# Altium schematic symbol library LATTICEPLDS_Library.SchLib: 291 symbols (part 31 of 32) (continued)
## LX256-F484C (continued)
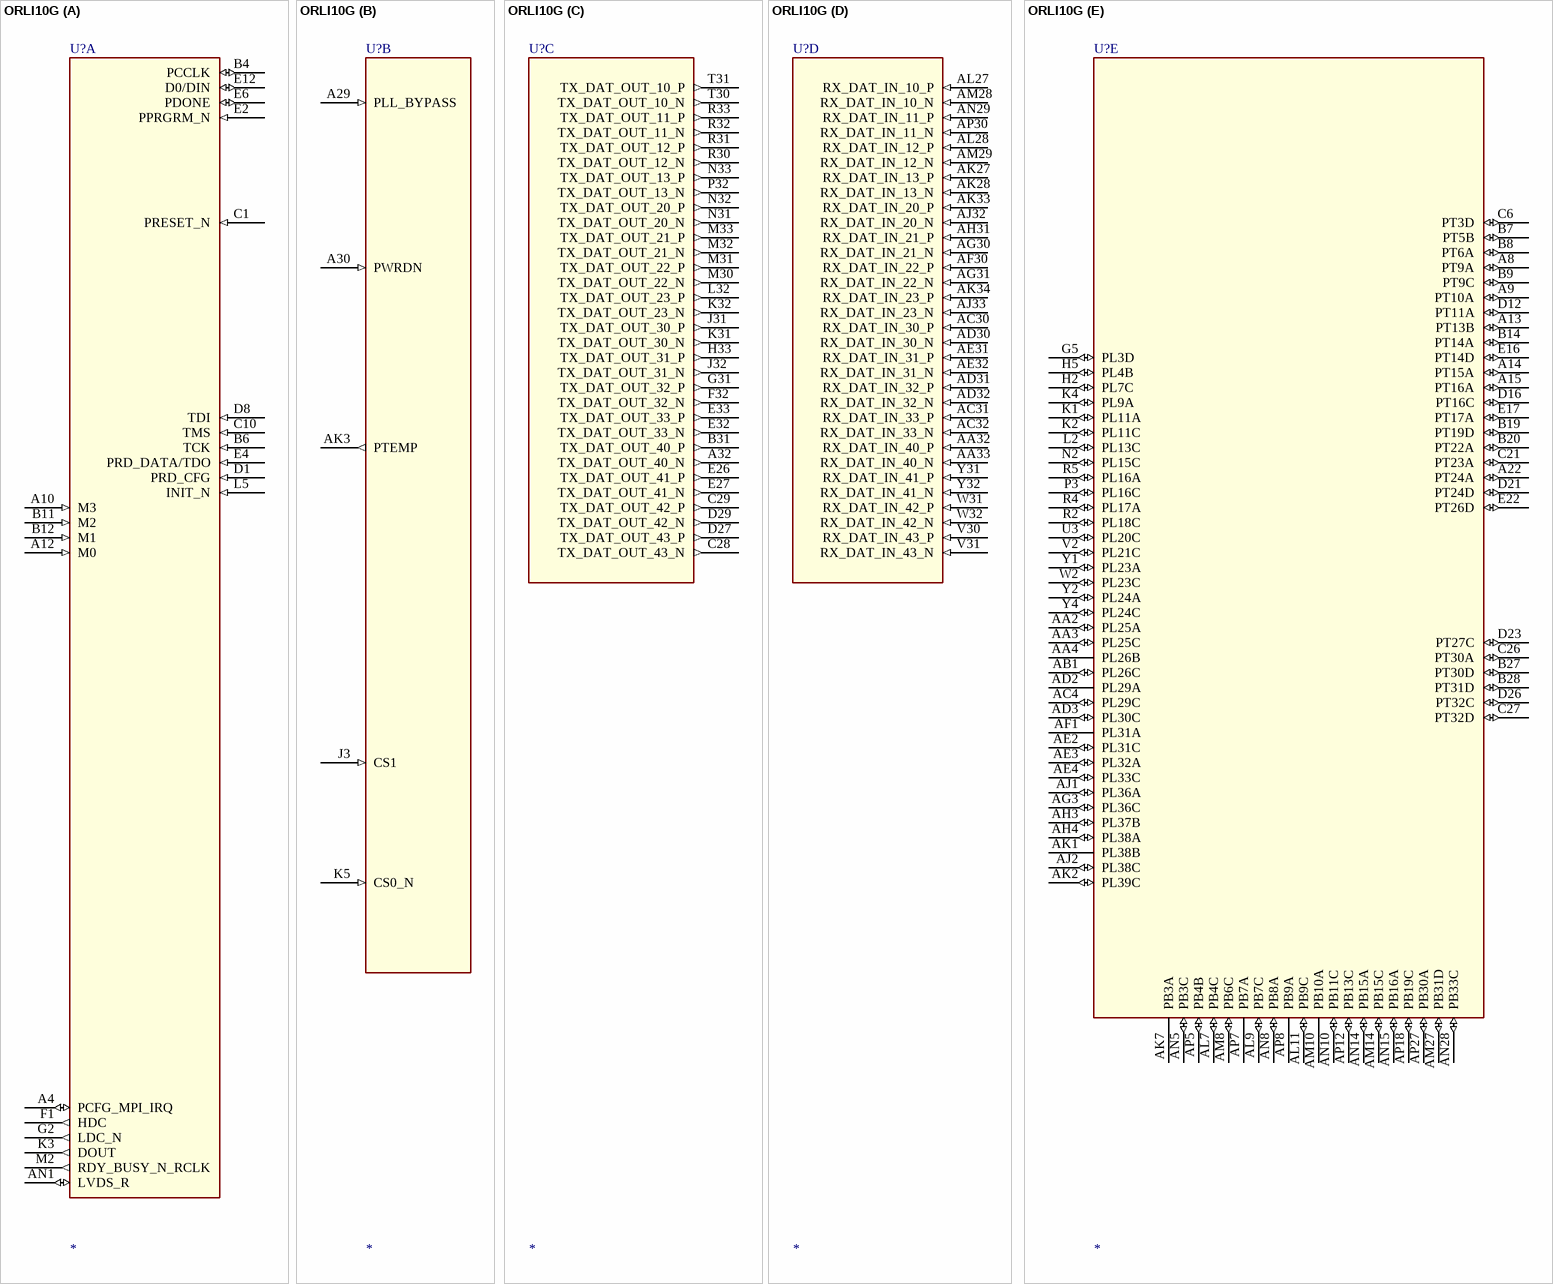
[diagram p287: symbol ORLI10G]

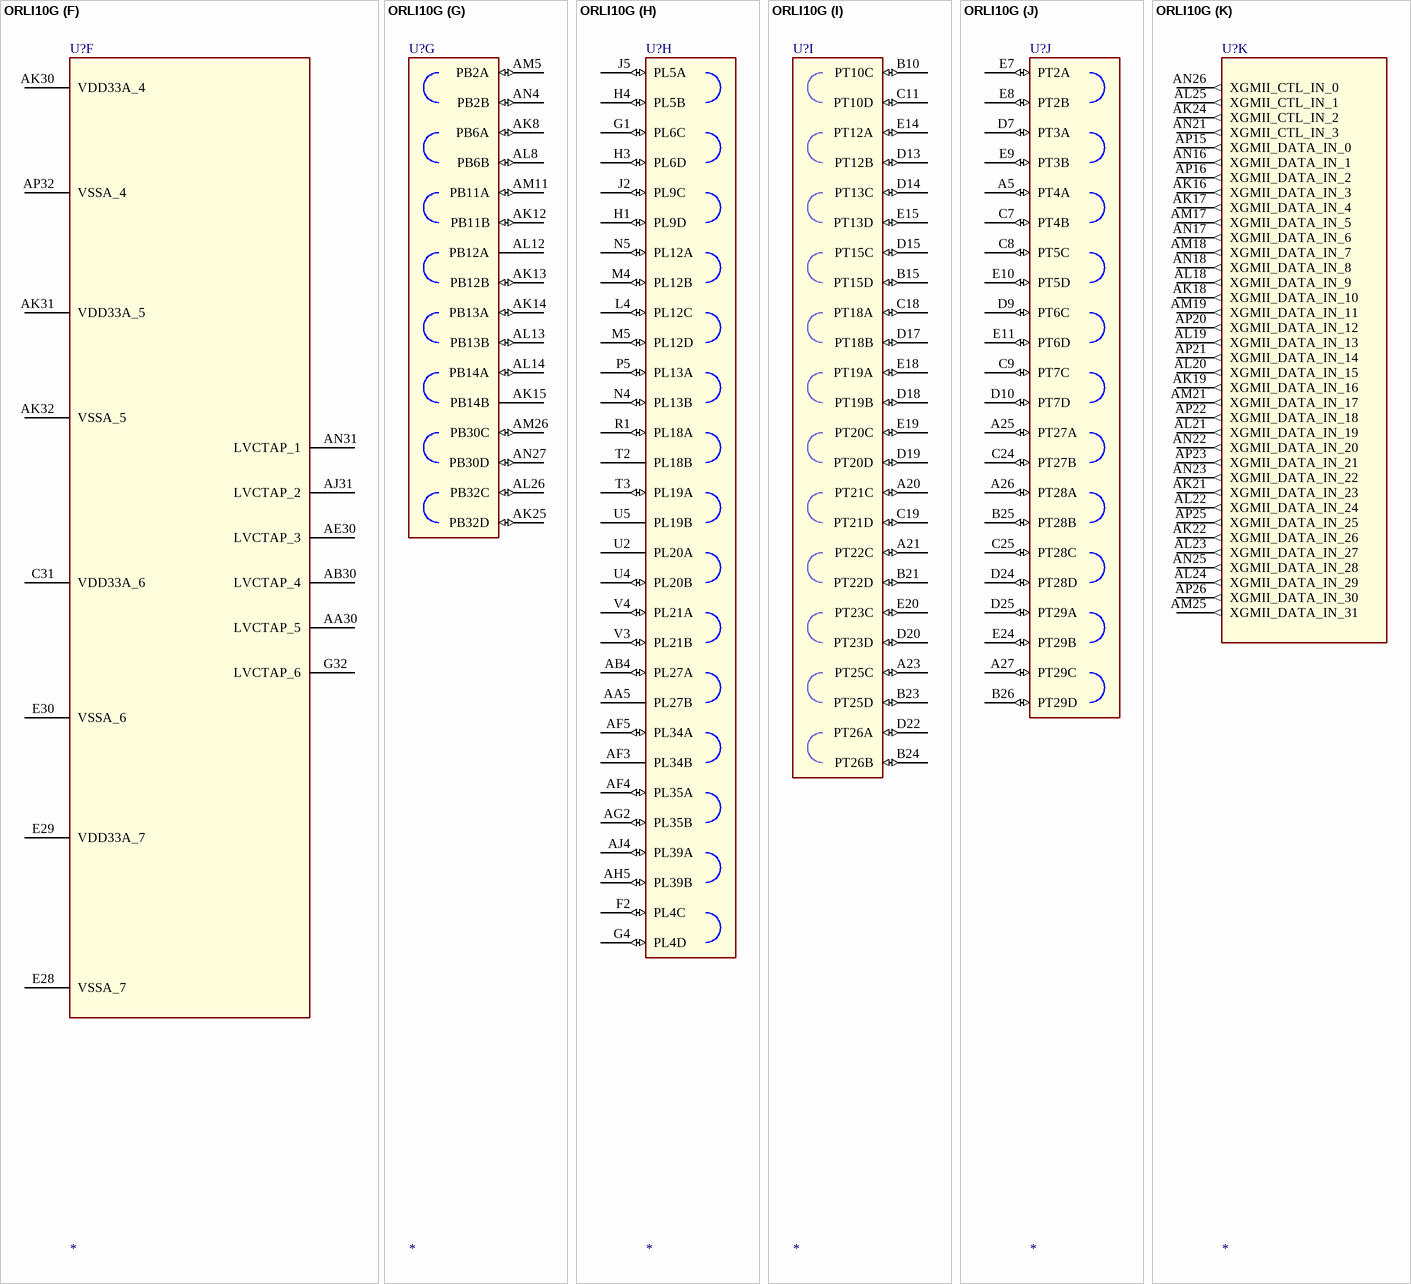
[diagram p288: symbol ORLI10G]

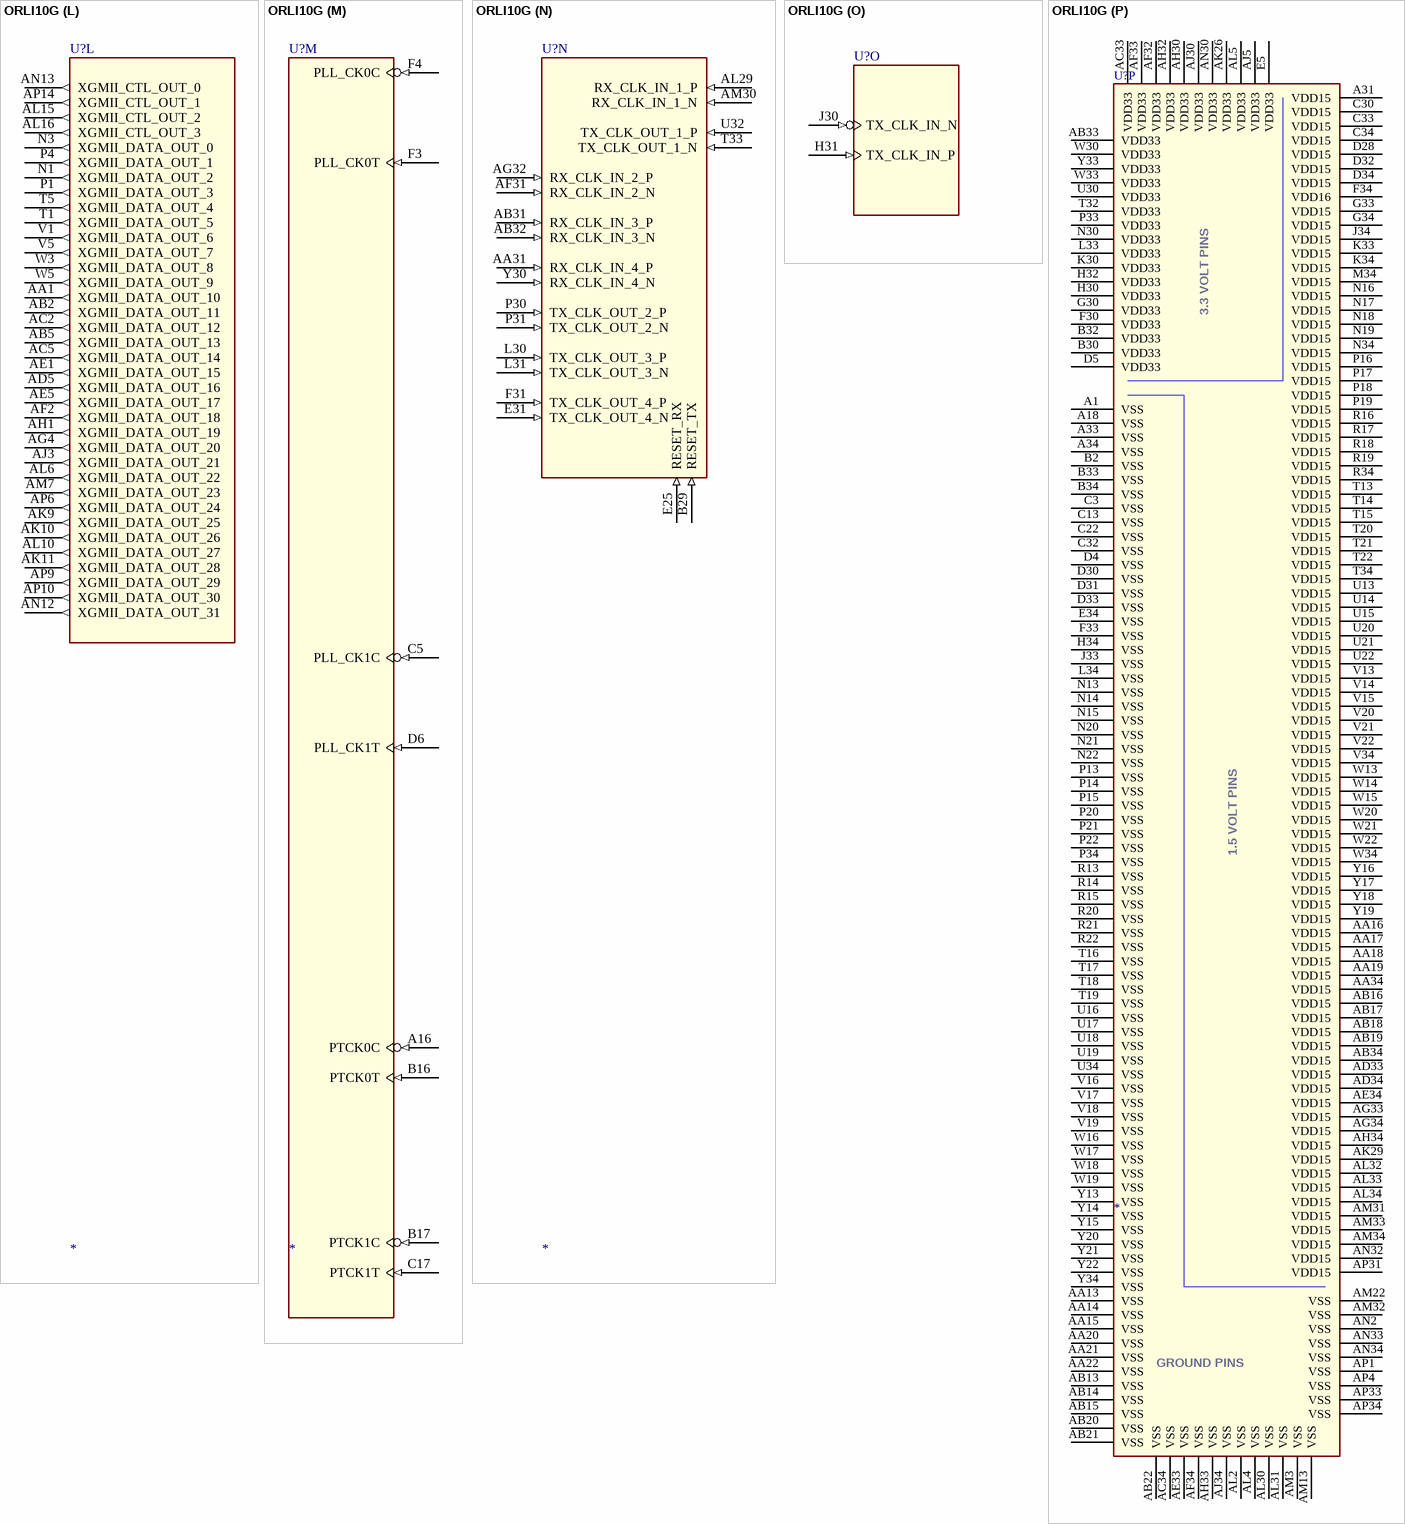
[diagram p289: symbol ORLI10G]

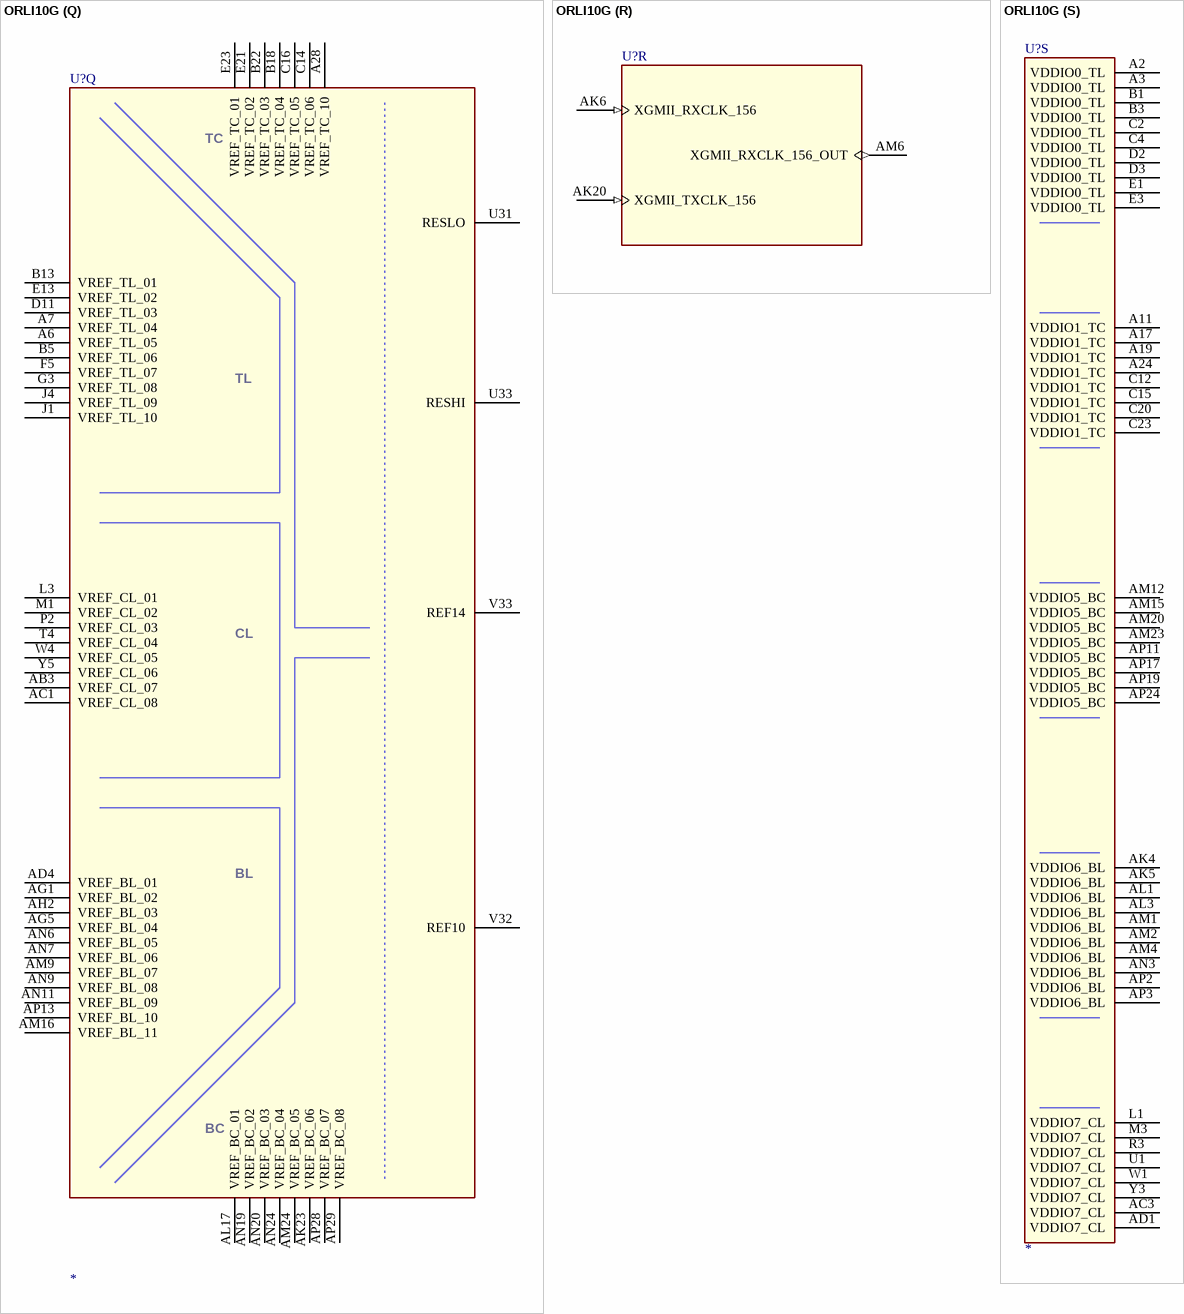
[diagram p290: symbol ORLI10G]

## ORLI10G
designator U?
footprint 680PIN_BGA
part A pins: A4 PCFG_MPI_IRQ (io), A10 M3 (in), A12 M0 (in), AN1 LVDS_R (io), B4 PCCLK (io), B6 TCK (in), B11 M2 (in), B12 M1 (in), C1 PRESET_N (in), C10 TMS (in), D1 PRD_CFG (in), D8 TDI (in), E2 PPRGRM_N (in), E4 PRD_DATA/TDO (in), E6 PDONE (io), E12 D0/DIN (io), F1 HDC (out), G2 LDC_N (out), K3 DOUT (out), L5 INIT_N (in), M2 RDY_BUSY_N_RCLK (out)
part B pins: A29 PLL_BYPASS (in), A30 PWRDN (in), AK3 PTEMP (out), J3 CS1 (in), K5 CS0_N (in)
part C pins: A32 TX_DAT_OUT_40_N (out), B31 TX_DAT_OUT_40_P (out), C28 TX_DAT_OUT_43_N (out), C29 TX_DAT_OUT_42_P (out), D27 TX_DAT_OUT_43_P (out), D29 TX_DAT_OUT_42_N (out), E26 TX_DAT_OUT_41_P (out), E27 TX_DAT_OUT_41_N (out), E32 TX_DAT_OUT_33_N (out), E33 TX_DAT_OUT_33_P (out), F32 TX_DAT_OUT_32_N (out), G31 TX_DAT_OUT_32_P (out), H33 TX_DAT_OUT_31_P (out), J31 TX_DAT_OUT_30_P (out), J32 TX_DAT_OUT_31_N (out), K31 TX_DAT_OUT_30_N (out), K32 TX_DAT_OUT_23_N (out), L32 TX_DAT_OUT_23_P (out), M30 TX_DAT_OUT_22_N (out), M31 TX_DAT_OUT_22_P (out), M32 TX_DAT_OUT_21_N (out), M33 TX_DAT_OUT_21_P (out), N31 TX_DAT_OUT_20_N (out), N32 TX_DAT_OUT_20_P (out), N33 TX_DAT_OUT_13_P (out), P32 TX_DAT_OUT_13_N (out), R30 TX_DAT_OUT_12_N (out), R31 TX_DAT_OUT_12_P (out), R32 TX_DAT_OUT_11_N (out), R33 TX_DAT_OUT_11_P (out), T30 TX_DAT_OUT_10_N (out), T31 TX_DAT_OUT_10_P (out)
part D pins: AA32 RX_DAT_IN_40_P (in), AA33 RX_DAT_IN_40_N (in), AC30 RX_DAT_IN_30_P (in), AC31 RX_DAT_IN_33_P (in), AC32 RX_DAT_IN_33_N (in), AD30 RX_DAT_IN_30_N (in), AD31 RX_DAT_IN_32_P (in), AD32 RX_DAT_IN_32_N (in), AE31 RX_DAT_IN_31_P (in), AE32 RX_DAT_IN_31_N (in), AF30 RX_DAT_IN_22_P (in), AG30 RX_DAT_IN_21_N (in), AG31 RX_DAT_IN_22_N (in), AH31 RX_DAT_IN_21_P (in), AJ32 RX_DAT_IN_20_N (in), AJ33 RX_DAT_IN_23_N (in), AK27 RX_DAT_IN_13_P (in), AK28 RX_DAT_IN_13_N (in), AK33 RX_DAT_IN_20_P (in), AK34 RX_DAT_IN_23_P (in), AL27 RX_DAT_IN_10_P (in), AL28 RX_DAT_IN_12_P (in), AM28 RX_DAT_IN_10_N (in), AM29 RX_DAT_IN_12_N (in), AN29 RX_DAT_IN_11_P (in), AP30 RX_DAT_IN_11_N (in), V30 RX_DAT_IN_43_P (in), V31 RX_DAT_IN_43_N (in), W31 RX_DAT_IN_42_P (in), W32 RX_DAT_IN_42_N (in), Y31 RX_DAT_IN_41_P (in), Y32 RX_DAT_IN_41_N (in)
part E pins: A8 PT9A (io), A9 PT10A (io), A13 PT13B (io), A14 PT15A (io), A15 PT16A (io), A22 PT24A (io), AA2 PL25A (io), AA3 PL25C (io), AA4 PL26B (power), AB1 PL26C (io), AC4 PL29C (io), AD2 PL29A (power), AD3 PL30C (io), AE2 PL31C (io), AE3 PL32A (io), AE4 PL33C (io), AF1 PL31A (power), AG3 PL36C (io), AH3 PL37B (io), AH4 PL38A (io), AJ1 PL36A (io), AJ2 PL38C (io), AK1 PL38B (power), AK2 PL39C (io), AK7 PB3A (power), AL7 PB4C (io), AL9 PB7C (io), AL11 PB9C (io), AM8 PB6C (io), AM10 PB10A (power), AM14 PB15C (io), AM27 PB31D (io), AN5 PB3C (io), AN8 PB8A (io), AN10 PB11C (io), AN14 PB15A (io), AN15 PB16A (io), AN28 PB33C (io), AP5 PB4B (io), AP7 PB7A (power), AP8 PB9A (power), AP12 PB13C (io), AP18 PB19C (io), AP27 PB30A (io), B7 PT5B (io), B8 PT6A (io), B9 PT9C (io), B14 PT14A (io), B19 PT19D (io), B20 PT22A (io), B27 PT30D (io), B28 PT31D (io), C6 PT3D (io), C21 PT23A (io), C26 PT30A (io), C27 PT32D (io), D12 PT11A (io), D16 PT16C (io), D21 PT24D (io), D23 PT27C (io), D26 PT32C (io), E16 PT14D (io), E17 PT17A (io), E22 PT26D (io), G5 PL3D (io), H2 PL7C (io), H5 PL4B (io), K1 PL11A (io), K2 PL11C (io), K4 PL9A (io), L2 PL13C (io), N2 PL15C (io), P3 PL16C (io), R2 PL18C (io), R4 PL17A (io), R5 PL16A (io), U3 PL20C (io), V2 PL21C (io), W2 PL23C (io), Y1 PL23A (io), Y2 PL24A (io), Y4 PL24C (io)
part F pins: AA30 LVCTAP_5, AB30 LVCTAP_4, AE30 LVCTAP_3, AJ31 LVCTAP_2, AK30 VDD33A_4 (power), AK31 VDD33A_5 (power), AK32 VSSA_5 (power), AN31 LVCTAP_1, AP32 VSSA_4 (power), C31 VDD33A_6 (power), E28 VSSA_7 (power), E29 VDD33A_7 (power), E30 VSSA_6 (power), G32 LVCTAP_6
part G pins: AK8 PB6A (io), AK12 PB11B (io), AK13 PB12B (io), AK14 PB13A (io), AK15 PB14B (power), AK25 PB32D (io), AL8 PB6B (io), AL12 PB12A (power), AL13 PB13B (io), AL14 PB14A (io), AL26 PB32C (io), AM5 PB2A (io), AM11 PB11A (io), AM26 PB30C (io), AN4 PB2B (io), AN27 PB30D (io)
part H pins: AA5 PL27B (power), AB4 PL27A (io), AF3 PL34B (power), AF4 PL35A (io), AF5 PL34A (io), AG2 PL35B (io), AH5 PL39B (io), AJ4 PL39A (io), F2 PL4C (io), G1 PL6C (io), G4 PL4D (io), H1 PL9D (io), H3 PL6D (io), H4 PL5B (io), J2 PL9C (io), J5 PL5A (io), L4 PL12C (io), M4 PL12B (io), M5 PL12D (io), N4 PL13B (io), N5 PL12A (io), P5 PL13A (io), R1 PL18A (io), T2 PL18B (power), T3 PL19A (io), U2 PL20A (power), U4 PL20B (io), U5 PL19B (power), V3 PL21B (io), V4 PL21A (io)
part I pins: A20 PT21C (io), A21 PT22C (io), A23 PT25C (io), B10 PT10C (io), B15 PT15D (io), B21 PT22D (io), B23 PT25D (io), B24 PT26B (io), C11 PT10D (io), C18 PT18A (io), C19 PT21D (io), D13 PT12B (io), D14 PT13C (io), D15 PT15C (io), D17 PT18B (io), D18 PT19B (io), D19 PT20D (io), D20 PT23D (io), D22 PT26A (io), E14 PT12A (io), E15 PT13D (io), E18 PT19A (io), E19 PT20C (io), E20 PT23C (io)
part J pins: A5 PT4A (io), A25 PT27A (io), A26 PT28A (io), A27 PT29C (io), B25 PT28B (io), B26 PT29D (io), C7 PT4B (io), C8 PT5C (io), C9 PT7C (io), C24 PT27B (io), C25 PT28C (io), D7 PT3A (io), D9 PT6C (io), D10 PT7D (io), D24 PT28D (io), D25 PT29A (io), E7 PT2A (io), E8 PT2B (io), E9 PT3B (io), E10 PT5D (io), E11 PT6D (io), E24 PT29B (io)
part K pins: AK16 XGMII_DATA_IN_3 (out), AK17 XGMII_DATA_IN_4 (out), AK18 XGMII_DATA_IN_10 (out), AK19 XGMII_DATA_IN_16 (out), AK21 XGMII_DATA_IN_23 (out), AK22 XGMII_DATA_IN_26 (out), AK24 XGMII_CTL_IN_2 (out), AL18 XGMII_DATA_IN_9 (out), AL19 XGMII_DATA_IN_13 (out), AL20 XGMII_DATA_IN_15 (out), AL21 XGMII_DATA_IN_19 (out), AL22 XGMII_DATA_IN_24 (out), AL23 XGMII_DATA_IN_27 (out), AL24 XGMII_DATA_IN_29 (out), AL25 XGMII_CTL_IN_1 (out), AM17 XGMII_DATA_IN_5 (out), AM18 XGMII_DATA_IN_7 (out), AM19 XGMII_DATA_IN_11 (out), AM21 XGMII_DATA_IN_17 (out), AM25 XGMII_DATA_IN_31 (out), AN16 XGMII_DATA_IN_1 (out), AN17 XGMII_DATA_IN_6 (out), AN18 XGMII_DATA_IN_8 (out), AN21 XGMII_CTL_IN_3 (out), AN22 XGMII_DATA_IN_20 (out), AN23 XGMII_DATA_IN_22 (out), AN25 XGMII_DATA_IN_28 (out), AN26 XGMII_CTL_IN_0 (out), AP15 XGMII_DATA_IN_0 (out), AP16 XGMII_DATA_IN_2 (out), AP20 XGMII_DATA_IN_12 (out), AP21 XGMII_DATA_IN_14 (out), AP22 XGMII_DATA_IN_18 (out), AP23 XGMII_DATA_IN_21 (out), AP25 XGMII_DATA_IN_25 (out), AP26 XGMII_DATA_IN_30 (out)
part L pins: AA1 XGMII_DATA_OUT_10 (out), AB2 XGMII_DATA_OUT_11 (out), AB5 XGMII_DATA_OUT_13 (out), AC2 XGMII_DATA_OUT_12 (out), AC5 XGMII_DATA_OUT_14 (out), AD5 XGMII_DATA_OUT_16 (out), AE1 XGMII_DATA_OUT_15 (out), AE5 XGMII_DATA_OUT_17 (out), AF2 XGMII_DATA_OUT_18 (out), AG4 XGMII_DATA_OUT_20 (out), AH1 XGMII_DATA_OUT_19 (out), AJ3 XGMII_DATA_OUT_21 (out), AK9 XGMII_DATA_OUT_25 (out), AK10 XGMII_DATA_OUT_26 (out), AK11 XGMII_DATA_OUT_28 (out), AL6 XGMII_DATA_OUT_22 (out), AL10 XGMII_DATA_OUT_27 (out), AL15 XGMII_CTL_OUT_2 (out), AL16 XGMII_CTL_OUT_3 (out), AM7 XGMII_DATA_OUT_23 (out), AN12 XGMII_DATA_OUT_31 (out), AN13 XGMII_CTL_OUT_0 (out), AP6 XGMII_DATA_OUT_24 (out), AP9 XGMII_DATA_OUT_29 (out), AP10 XGMII_DATA_OUT_30 (out), AP14 XGMII_CTL_OUT_1 (out), N1 XGMII_DATA_OUT_2 (out), N3 XGMII_DATA_OUT_0 (out), P1 XGMII_DATA_OUT_3 (out), P4 XGMII_DATA_OUT_1 (out), T1 XGMII_DATA_OUT_5 (out), T5 XGMII_DATA_OUT_4 (out), V1 XGMII_DATA_OUT_6 (out), V5 XGMII_DATA_OUT_7 (out), W3 XGMII_DATA_OUT_8 (out), W5 XGMII_DATA_OUT_9 (out)
part M pins: A16 PTCK0C (in), B16 PTCK0T (in), B17 PTCK1C (in), C5 PLL_CK1C (in), C17 PTCK1T (in), D6 PLL_CK1T (in), F3 PLL_CK0T (in), F4 PLL_CK0C (in)
part N pins: AA31 RX_CLK_IN_4_P (in), AB31 RX_CLK_IN_3_P (in), AB32 RX_CLK_IN_3_N (in), AF31 RX_CLK_IN_2_N (in), AG32 RX_CLK_IN_2_P (in), AL29 RX_CLK_IN_1_P (in), AM30 RX_CLK_IN_1_N (in), B29 RESET_TX (in), E25 RESET_RX (in), E31 TX_CLK_OUT_4_N (in), F31 TX_CLK_OUT_4_P (in), L30 TX_CLK_OUT_3_P (in), L31 TX_CLK_OUT_3_N (in), P30 TX_CLK_OUT_2_P (in), P31 TX_CLK_OUT_2_N (in), T33 TX_CLK_OUT_1_N (in), U32 TX_CLK_OUT_1_P (in), Y30 RX_CLK_IN_4_N (in)
part O pins: H31 TX_CLK_IN_P (in), J30 TX_CLK_IN_N (in)
part P pins: A1 VSS (power), A18 VSS (power), A31 VDD15 (power), A33 VSS (power), A34 VSS (power), AA13 VSS (power), AA14 VSS (power), AA15 VSS (power), AA16 VDD15 (power), AA17 VDD15 (power), AA18 VDD15 (power), AA19 VDD15 (power), AA20 VSS (power), AA21 VSS (power), AA22 VSS (power), AA34 VDD15 (power), AB13 VSS (power), AB14 VSS (power), AB15 VSS (power), AB16 VDD15 (power), AB17 VDD15 (power), AB18 VDD15 (power), AB19 VDD15 (power), AB20 VSS (power), AB21 VSS (power), AB22 VSS (power), AB33 VDD33 (power), AB34 VDD15 (power), AC33 VDD33 (power), AC34 VSS (power), AD33 VDD15 (power), AD34 VDD15 (power), AE33 VSS (power), AE34 VDD15 (power), AF32 VDD33 (power), AF33 VDD33 (power), AF34 VSS (power), AG33 VDD15 (power), AG34 VDD15 (power), AH30 VDD33 (power), AH32 VDD33 (power), AH33 VSS (power), AH34 VDD15 (power), AJ5 VDD33 (power), AJ30 VDD33 (power), AJ34 VSS (power), AK26 VDD33 (power), AK29 VDD15 (power), AL2 VSS (power), AL4 VSS (power), AL5 VDD33 (power), AL30 VSS (power), AL31 VSS (power), AL32 VDD15 (power), AL33 VDD15 (power), AL34 VDD15 (power), AM3 VSS (power), AM13 VSS (power), AM22 VSS (power), AM31 VDD15 (power), AM32 VSS (power), AM33 VDD15 (power), AM34 VDD15 (power), AN2 VSS (power), AN30 VDD33 (power), AN32 VDD15 (power), AN33 VSS (power), AN34 VSS (power), AP1 VSS (power), AP4 VSS (power), AP31 VDD15 (power), AP33 VSS (power), AP34 VSS (power), B2 VSS (power), B30 VDD33 (power), B32 VDD33 (power), B33 VSS (power), B34 VSS (power), C3 VSS (power), C13 VSS (power), C22 VSS (power), C30 VDD15 (power), C32 VSS (power), C33 VDD15 (power), C34 VDD15 (power), D4 VSS (power), D5 VDD33 (power), D28 VDD15 (power), D30 VSS (power), D31 VSS (power), D32 VDD15 (power), D33 VSS (power), D34 VDD15 (power), E5 VDD33 (power), E34 VSS (power), F30 VDD33 (power), F33 VSS (power), F34 VDD16 (power), G30 VDD33 (power), G33 VDD15 (power), G34 VDD15 (power), H30 VDD33 (power), H32 VDD33 (power), H34 VSS (power), J33 VSS (power), J34 VDD15 (power), K30 VDD33 (power), K33 VDD15 (power), K34 VDD15 (power), L33 VDD33 (power), L34 VSS (power), M34 VDD15 (power), N13 VSS (power), N14 VSS (power), N15 VSS (power), N16 VDD15 (power), N17 VDD15 (power), N18 VDD15 (power), N19 VDD15 (power), N20 VSS (power), N21 VSS (power), N22 VSS (power), N30 VDD33 (power), N34 VDD15 (power), P13 VSS (power), P14 VSS (power), P15 VSS (power), P16 VDD15 (power), P17 VDD15 (power), P18 VDD15 (power), P19 VDD15 (power), P20 VSS (power), P21 VSS (power), P22 VSS (power), P33 VDD33 (power), P34 VSS (power), R13 VSS (power), R14 VSS (power), R15 VSS (power), R16 VDD15 (power), R17 VDD15 (power), R18 VDD15 (power), R19 VDD15 (power), R20 VSS (power), R21 VSS (power), R22 VSS (power), R34 VDD15 (power), T13 VDD15 (power), T14 VDD15 (power), T15 VDD15 (power), T16 VSS (power), T17 VSS (power), T18 VSS (power), T19 VSS (power), T20 VDD15 (power), T21 VDD15 (power), T22 VDD15 (power), T32 VDD33 (power), T34 VDD15 (power), U13 VDD15 (power), U14 VDD15 (power), U15 VDD15 (power), U16 VSS (power), U17 VSS (power), U18 VSS (power), U19 VSS (power), U20 VDD15 (power), U21 VDD15 (power), U22 VDD15 (power), U30 VDD33 (power), U34 VSS (power), V13 VDD15 (power), V14 VDD15 (power), V15 VDD15 (power), V16 VSS (power), V17 VSS (power), V18 VSS (power), V19 VSS (power), V20 VDD15 (power), V21 VDD15 (power), V22 VDD15 (power), V34 VDD15 (power), W13 VDD15 (power), W14 VDD15 (power), W15 VDD15 (power), W16 VSS (power), W17 VSS (power), W18 VSS (power), W19 VSS (power), W20 VDD15 (power), W21 VDD15 (power), W22 VDD15 (power), W30 VDD33 (power), W33 VDD33 (power), W34 VDD15 (power), Y13 VSS (power), Y14 VSS (power), Y15 VSS (power), Y16 VDD15 (power), Y17 VDD15 (power), Y18 VDD15 (power), Y19 VDD15 (power), Y20 VSS (power), Y21 VSS (power), Y22 VSS (power), Y33 VDD33 (power), Y34 VSS (power)
part Q pins: A6 VREF_TL_05, A7 VREF_TL_04, A28 VREF_TC_10, AB3 VREF_CL_07, AC1 VREF_CL_08, AD4 VREF_BL_01 (power), AG1 VREF_BL_02, AG5 VREF_BL_04, AH2 VREF_BL_03 (power), AK23 VREF_BC_06, AL17 VREF_BC_01 (power), AM9 VREF_BL_07 (power), AM16 VREF_BL_11, AM24 VREF_BC_05 (power), AN6 VREF_BL_05, AN7 VREF_BL_06, AN9 VREF_BL_08, AN11 VREF_BL_09, AN19 VREF_BC_02 (power), AN20 VREF_BC_03, AN24 VREF_BC_04 (power), AP13 VREF_BL_10 (power), AP28 VREF_BC_07, AP29 VREF_BC_08, B5 VREF_TL_06, B13 VREF_TL_01, B18 VREF_TC_04, B22 VREF_TC_03, C14 VREF_TC_06, C16 VREF_TC_05, D11 VREF_TL_03, E13 VREF_TL_02, E21 VREF_TC_02, E23 VREF_TC_01, F5 VREF_TL_07, G3 VREF_TL_08, J1 VREF_TL_10, J4 VREF_TL_09, L3 VREF_CL_01, M1 VREF_CL_02, P2 VREF_CL_03 (power), T4 VREF_CL_04, U31 RESLO, U33 RESHI, V32 REF10, V33 REF14, W4 VREF_CL_05 (power), Y5 VREF_CL_06
part R pins: AK6 XGMII_RXCLK_156 (in), AK20 XGMII_TXCLK_156 (in), AM6 XGMII_RXCLK_156_OUT (out)
part S pins: A2 VDDIO0_TL (power), A3 VDDIO0_TL (power), A11 VDDIO1_TC (power), A17 VDDIO1_TC (power), A19 VDDIO1_TC (power), A24 VDDIO1_TC (power), AC3 VDDIO7_CL (power), AD1 VDDIO7_CL (power), AK4 VDDIO6_BL (power), AK5 VDDIO6_BL (power), AL1 VDDIO6_BL (power), AL3 VDDIO6_BL (power), AM1 VDDIO6_BL (power), AM2 VDDIO6_BL (power), AM4 VDDIO6_BL (power), AM12 VDDIO5_BC (power), AM15 VDDIO5_BC (power), AM20 VDDIO5_BC (power), AM23 VDDIO5_BC (power), AN3 VDDIO6_BL (power), AP2 VDDIO6_BL (power), AP3 VDDIO6_BL (power), AP11 VDDIO5_BC (power), AP17 VDDIO5_BC (power), AP19 VDDIO5_BC (power), AP24 VDDIO5_BC (power), B1 VDDIO0_TL (power), B3 VDDIO0_TL (power), C2 VDDIO0_TL (power), C4 VDDIO0_TL (power), C12 VDDIO1_TC (power), C15 VDDIO1_TC (power), C20 VDDIO1_TC (power), C23 VDDIO1_TC (power), D2 VDDIO0_TL (power), D3 VDDIO0_TL (power), E1 VDDIO0_TL (power), E3 VDDIO0_TL (power), L1 VDDIO7_CL (power), M3 VDDIO7_CL (power), R3 VDDIO7_CL (power), U1 VDDIO7_CL (power), W1 VDDIO7_CL (power), Y3 VDDIO7_CL (power)
